# Altium footprint library Gesturelink PCB Library.PcbLib: 57 footprints (part 3 of 4)
Each footprint in its own frame and in the unit in brackets; x right, y up, seen from the top. Pads: shape width x height; smd on the part's side, far side on the other; paste and mask are expansions set on the pad; w line width, h text height; cw(c..) or ccw(c..) is an arc to the next point about the centre after c.
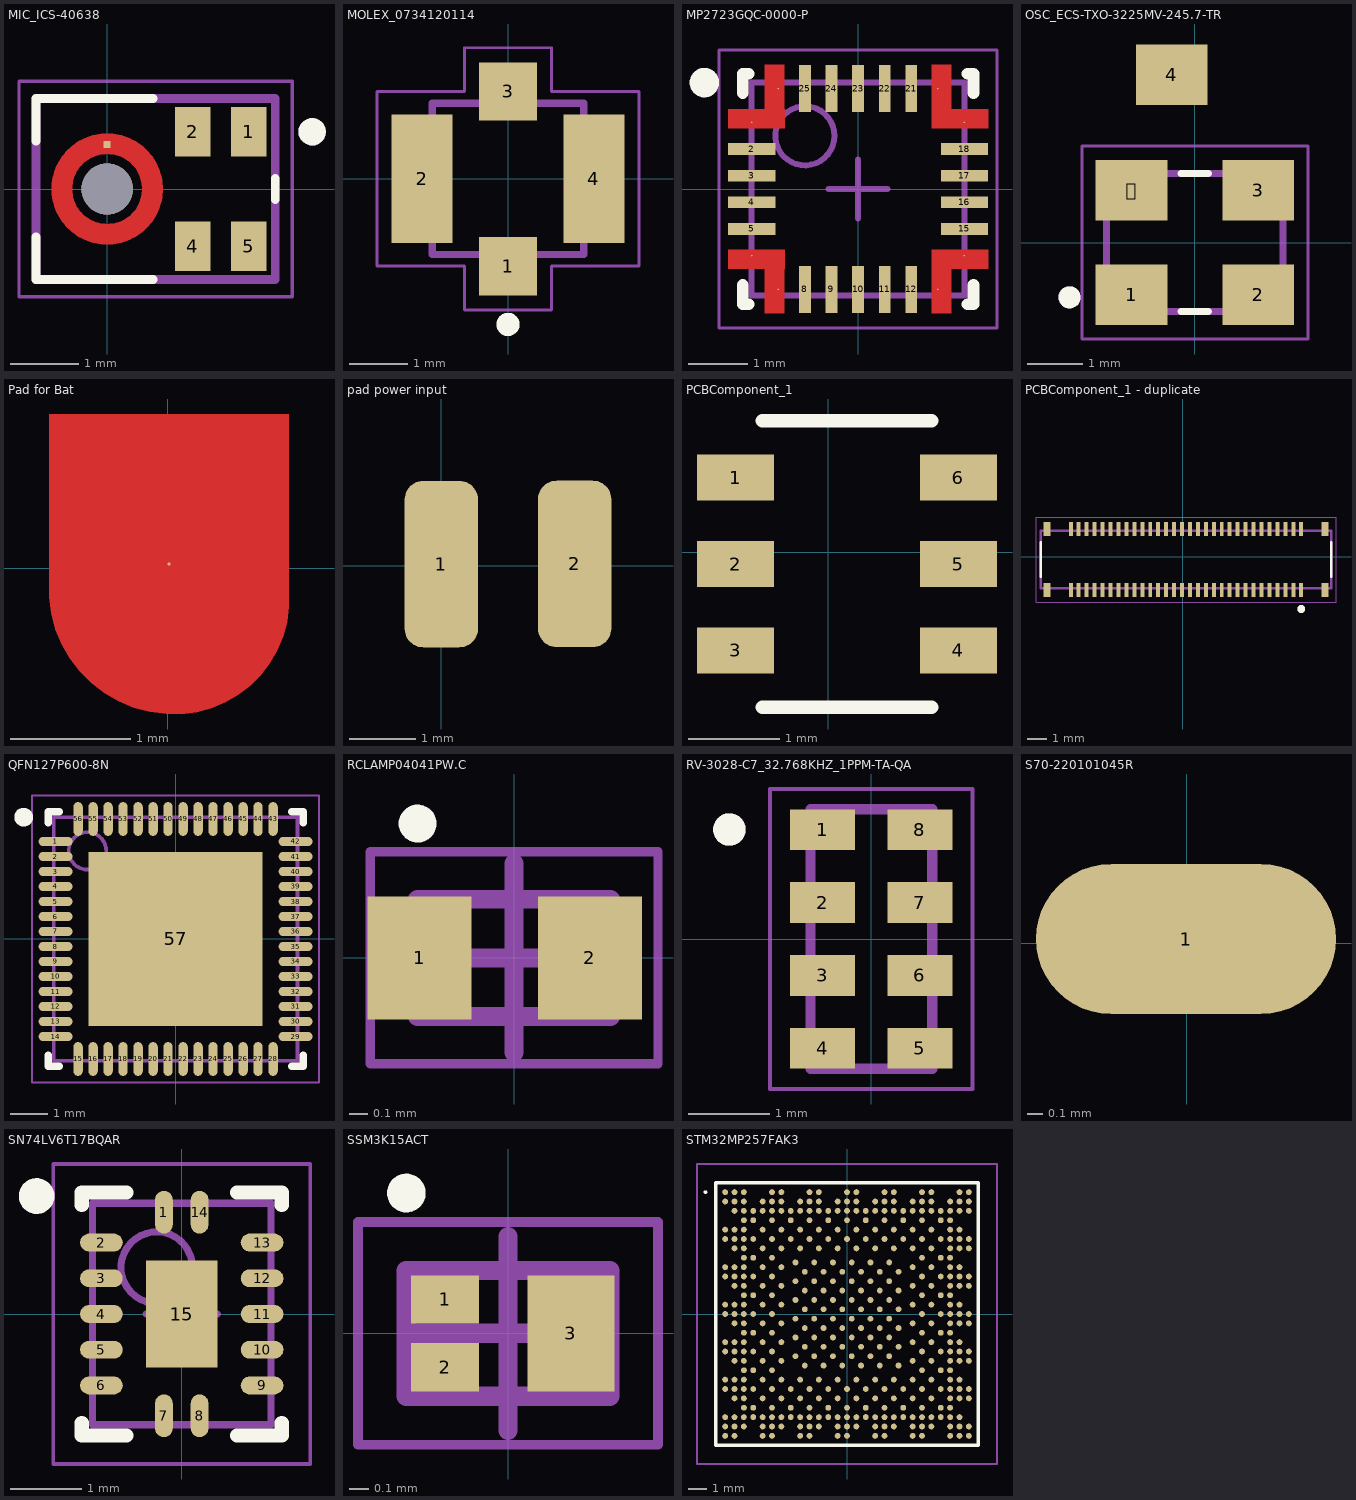
[diagram p2: the footprints below, top view; thin cyan lines are the x and y axes]

## MIC_ICS-40638 [mm]
pads (6):
  rect 0.522x0.725 smd paste-1: 1(2.074,0.837) 2(1.252,0.837) 4(1.252,-0.837) 5(2.074,-0.837)
  rect 0.1x0.1 smd paste-1 mask+0: 3(0,0.65)
  round 0.75 hole 0.75 unplated: ""(0,0)
Top Layer:
  region: 242 vertices and 0 holes, not listed, extent -0.813,-0.813 0.813,0.813
Top Overlay:
  circle w0.2: c3,0.837 r0.1
  lines w0.127: -1.04,-0.7 -1.04,-1.325 0.671,-1.325 ; -1.04,0.7 -1.04,1.325 0.671,1.325 ; 2.46,-0.155 2.46,0.155
Top Paste:
  drawing of 8 lines, arcs and shapes, not listed
Top Solder:
  circle w0.913: c0,0 r0.456
Mechanical 13:
  circle w0.2: c3,0.837 r0.1
  lines w0.127: -1.04,-1.325 -1.04,1.325 2.46,1.325 2.46,-1.325 -1.04,-1.325
Mechanical 15:
  lines w0.05: -1.29,-1.575 -1.29,1.575 2.71,1.575 2.71,-1.575 -1.29,-1.575

## MOLEX_0734120114 [mm]
pads (4):
  rect 1x1 smd: 1(0,-1.5) 3(0,1.5)
  rect 1.05x2.2 smd: 2(-1.475,0) 4(1.475,0)
Top Overlay:
  circle w0.2: c0,-2.5 r0.1
Bottom Solder:
  region: -0.85,-1.202 -2.104,-1.202 -2.104,1.2 -0.85,1.2
  region: 2.1,-1.201 0.851,-1.201 0.851,1.2 2.1,1.2
  region: 0.6,0.901 -0.601,0.901 -0.601,2.1 0.6,2.1
Mechanical 13:
  lines w0.127: -1.3,-1.3 -1.3,1.3 1.3,1.3 1.3,-1.3 -1.3,-1.3
Mechanical 15:
  lines w0.05: -2.25,-1.5 -2.25,1.5 -0.75,1.5 -0.75,2.25 0.75,2.25 0.75,1.5 2.25,1.5 2.25,-1.5 0.75,-1.5 0.75,-2.25 -0.75,-2.25 -0.75,-1.5 -2.25,-1.5
3D body "0734120110.stp": height 1.3, standoff 0.05, extent -1.5,-1.54 1.5,1.54

## MP2723GQC-0000-P [mm] "Charger IC Lithium Ion/Polymer 26-QFN (3.5x3.5)"
height 0.8
pads (26):
  round 0.025 smd: 1(-1.8,1.125) 6(-1.8,-1.125) 7(-1.35,-1.7) 13(1.35,-1.7) 14(1.8,-1.125) 19(1.8,1.125) 20(1.35,1.7) 26(-1.35,1.7)
  rect 0.8x0.2 smd: 2(-1.8,0.675) 3(-1.8,0.225) 4(-1.8,-0.225) 5(-1.8,-0.675) 15(1.8,-0.675) 16(1.8,-0.225) 17(1.8,0.225) 18(1.8,0.675)
  rect 0.2x0.8 smd: 8(-0.9,-1.7) 9(-0.45,-1.7) 10(0,-1.7) 11(0.45,-1.7) 12(0.9,-1.7) 21(0.9,1.7) 22(0.45,1.7) 23(0,1.7) 24(-0.45,1.7) 25(-0.9,1.7)
Top Layer:
  region: -2.2,1.025 -1.245,1.025 -1.245,1.346 -2.2,1.346
  region: -1.575,2.1 -1.575,1.3 -1.25,1.3 -1.25,2.1
  region: -1.575,-1.3 -1.575,-2.1 -1.25,-2.1 -1.25,-1.3
  region: 1.25,-1.3 1.25,-2.1 1.575,-2.1 1.575,-1.3
  region: 1.245,-1.346 2.2,-1.346 2.2,-1.025 1.245,-1.025
  region: 1.245,1.025 2.2,1.025 2.2,1.346 1.245,1.346
  region: 1.25,2.1 1.25,1.3 1.575,1.3 1.575,2.1
  region: -2.2,-1.346 -1.245,-1.346 -1.245,-1.025 -2.2,-1.025
Top Overlay:
  circle w0.25: c-2.6,1.8 r0.125
  lines w0.2: -1.95,-1.625 -1.95,-1.95 -1.85,-1.95 ; -1.95,1.625 -1.95,1.95 -1.85,1.95 ; 1.85,-1.95 1.95,-1.95 1.95,-1.625 ; 1.85,1.95 1.95,1.95 1.95,1.625
Mechanical 13:
  circle w0.1: c-0.9,0.9 r0.5
  lines w0.1: -1.8,-1.8 -1.8,1.8 1.8,1.8 1.8,-1.8 -1.8,-1.8
Mechanical 15:
  lines w0.05: -2.35,-2.35 -2.35,2.35 2.35,2.35 2.35,-2.35 -2.35,-2.35
  lines w0.1: -0.5,0 0.5,0 ; 0,-0.5 0,0.5
3D body: height 0.8, standoff 0.05, extent -1.8,-1.8 1.8,1.8

## OSC_ECS-TXO-3225MV-245.7-TR [mm]
pads (5):
  rect 1.3x1.1 smd: 1(-1.15,-0.95) 2(1.15,-0.95) 3(1.15,0.95) 4(-0.42,3.041) (-1.15,0.95)
Top Overlay:
  circle w0.2: c-2.275,-0.994 r0.1
  lines w0.127: -0.25,-1.25 0.25,-1.25 ; -0.25,1.25 0.25,1.25
Mechanical 13:
  circle w0.2: c-2.275,-0.994 r0.1
  lines w0.127: -1.6,-1.25 -1.6,1.25 1.6,1.25 1.6,-1.25 -1.6,-1.25
Mechanical 15:
  lines w0.05: -2.05,-1.75 2.05,-1.75 2.05,1.75 -2.05,1.75 -2.05,-1.75
3D body "step_temp.STEP": height 1.2, standoff 0, extent -1.6,-1.25 1.6,1.25

## Pad for Bat [mil]
pads (1):
  round 1 smd: 1(0.38,1.34)
Top Layer:
  region: -38.99,-6.76 -38.99,50.55 39.75,50.55 39.75,-10.25 39.75,-12.72 39.1,-17.61 37.83,-22.37 35.94,-26.93 33.48,-31.2 30.47,-35.11 26.99,-38.6 23.07,-41.6 18.8,-44.07 14.25,-45.95 9.48,-47.23 4.59,-47.87 2.13,-47.87 -0.57,-47.87 -5.91,-47.17 -11.12,-45.78 -16.1,-43.71 -20.77,-41.02 -25.04,-37.74 -28.85,-33.93 -32.14,-29.65 -34.83,-24.98 -36.89,-20 -38.29,-14.8 -38.99,-9.45

## pad power input [mm]
pads (2):
  rrect50% 1.1x2.5 smd: 1(-0.003,0.022) 2(2,0.025)

## PCBComponent_1 [mil]
pads (6):
  rect 33.41x20 smd paste+0 mask+0: 1(-40,32.4) 2(-40,-5) 3(-40,-42.4) 4(56.41,-42.4) 5(56.41,-5) 6(56.41,32.4)
Top Overlay:
  lines w6: -28.3,-67 44.7,-67 ; -28.3,57 44.7,57
3D body "TLV9061SQDBVRQ1--3DModel-STEP-56544.STEP": height 57.09, standoff 0, extent -50.12,-62.09 60.12,52.09

## PCBComponent_1 - duplicate [mm]
pads (64):
  rect 0.2x0.7 smd paste-1 mask+0.05: 1(5.968,-1.683) 2(5.968,1.397) 3(5.568,-1.683) 4(5.568,1.397) 5(5.168,-1.683) 6(5.168,1.397) 7(4.768,-1.683) 8(4.768,1.397) 9(4.368,-1.683) 10(4.368,1.397) 11(3.968,-1.683) 12(3.968,1.397) 13(3.568,-1.683) 14(3.568,1.397) 15(3.168,-1.683) 16(3.168,1.397) 17(2.768,-1.683) 18(2.768,1.397) 19(2.368,-1.683) 20(2.368,1.397) 21(1.968,-1.683) 22(1.968,1.397) 23(1.568,-1.683) 24(1.568,1.397) 25(1.168,-1.683) 26(1.168,1.397) 27(0.768,-1.683) 28(0.768,1.397) 29(0.368,-1.683) 30(0.368,1.397) 31(-0.032,-1.683) 32(-0.032,1.397) 33(-0.432,-1.683) 34(-0.432,1.397) 35(-0.832,-1.683) 36(-0.832,1.397) 37(-1.232,-1.683) 38(-1.232,1.397) 39(-1.632,-1.683) 40(-1.632,1.397) 41(-2.032,-1.683) 42(-2.032,1.397) 43(-2.432,-1.683) 44(-2.432,1.397) 45(-2.832,-1.683) 46(-2.832,1.397) 47(-3.232,-1.683) 48(-3.232,1.397) 49(-3.632,-1.683) 50(-3.632,1.397) 51(-4.032,-1.683) 52(-4.032,1.397) 53(-4.432,-1.683) 54(-4.432,1.397) 55(-4.832,-1.683) 56(-4.832,1.397) 57(-5.232,-1.683) 58(-5.232,1.397) 59(-5.632,-1.683) 60(-5.632,1.397)
  rect 0.35x0.7 smd paste-1: S1(7.168,-1.683) S2(7.168,1.397) S3(-6.832,-1.683) S4(-6.832,1.397)
Top Overlay:
  circle w0.2: c5.968,-2.633 r0.1
  lines w0.127: -7.132,-1.013 -7.132,0.727 ; 7.468,-1.013 7.468,0.727
Top Paste:
  drawing of 64 lines, arcs and shapes, not listed
Mechanical 13:
  circle w0.2: c5.968,-2.633 r0.1
  lines w0.127: -7.132,-1.583 7.468,-1.583 7.468,1.297 -7.132,1.297 -7.132,-1.583
Mechanical 15:
  lines w0.05: -7.382,-2.283 -7.382,1.997 7.718,1.997 7.718,-2.283 -7.382,-2.283
3D body "df40c-60ds-0_4v_51_.stp": height 1.5, standoff 0.05, extent -7.132,-1.792 7.468,1.588

## QFN127P600-8N [mm]
height 0.9
pads (57):
  oval 0.9x0.25 smd: 1(-3.2,2.6) 2(-3.2,2.2) 3(-3.2,1.8) 4(-3.2,1.4) 5(-3.2,1) 6(-3.2,0.6) 7(-3.2,0.2) 8(-3.2,-0.2) 9(-3.2,-0.6) 10(-3.2,-1) 11(-3.2,-1.4) 12(-3.2,-1.8) 13(-3.2,-2.2) 14(-3.2,-2.6) 29(3.2,-2.6) 30(3.2,-2.2) 31(3.2,-1.8) 32(3.2,-1.4) 33(3.2,-1) 34(3.2,-0.6) 35(3.2,-0.2) 36(3.2,0.2) 37(3.2,0.6) 38(3.2,1) 39(3.2,1.4) 40(3.2,1.8) 41(3.2,2.2) 42(3.2,2.6)
  oval 0.25x0.9 smd: 15(-2.6,-3.2) 16(-2.2,-3.2) 17(-1.8,-3.2) 18(-1.4,-3.2) 19(-1,-3.2) 20(-0.6,-3.2) 21(-0.2,-3.2) 22(0.2,-3.2) 23(0.6,-3.2) 24(1,-3.2) 25(1.4,-3.2) 26(1.8,-3.2) 27(2.2,-3.2) 28(2.6,-3.2) 43(2.6,3.2) 44(2.2,3.2) 45(1.8,3.2) 46(1.4,3.2) 47(1,3.2) 48(0.6,3.2) 49(0.2,3.2) 50(-0.2,3.2) 51(-0.6,3.2) 52(-1,3.2) 53(-1.4,3.2) 54(-1.8,3.2) 55(-2.2,3.2) 56(-2.6,3.2)
  rect 4.65x4.65 smd: 57(0,0)
Top Overlay:
  circle w0.25: c-4.05,3.25 r0.125
  lines w0.2: -3.4,-3.1 -3.4,-3.4 -3.1,-3.4 ; -3.4,3.1 -3.4,3.4 -3.1,3.4 ; 3.1,-3.4 3.4,-3.4 3.4,-3.1 ; 3.1,3.4 3.4,3.4 3.4,3.1
Mechanical 13:
  circle w0.1: c-2.35,2.35 r0.5
  lines w0.1: -3.25,-3.25 -3.25,3.25 3.25,3.25 3.25,-3.25 -3.25,-3.25
Mechanical 15:
  lines w0.05: -3.825,-3.825 -3.825,3.825 3.825,3.825 3.825,-3.825 -3.825,-3.825
  lines w0.1: -0.5,0 0.5,0 ; 0,-0.5 0,0.5
3D body: height 0.9, standoff 0.05, extent -3.25,-3.25 3.25,3.25

## RCLAMP04041PW.C [mm]
height 0.55
pads (2):
  rect 0.55x0.65 smd: 1(-0.5,0) 2(0.4,0)
Top Overlay:
  circle w0.1: c-0.51,0.71 r0.05
Mechanical 13:
  lines w0.1: -0.51,-0.31 -0.51,0.31 0.51,0.31 0.51,-0.31 -0.51,-0.31
Mechanical 15:
  lines w0.05: -0.76,-0.56 -0.76,0.56 0.76,0.56 0.76,-0.56 -0.76,-0.56
  lines w0.1: -0.5,0 0.5,0 ; 0,-0.5 0,0.5
3D body: height 0.55, standoff 0.03, extent -0.56,-0.31 0.46,0.31

## RV-3028-C7_32.768KHZ_1PPM-TA-QA [mm]
height 0.8
pads (8):
  rect 0.8x0.5 smd: 1(-0.6,1.35) 2(-0.6,0.45) 3(-0.6,-0.45) 4(-0.6,-1.35) 5(0.6,-1.35) 6(0.6,-0.45) 7(0.6,0.45) 8(0.6,1.35)
Top Overlay:
  circle w0.2: c-1.75,1.35 r0.1
Mechanical 13:
  circle w0.2: c-1.75,1.35 r0.1
  lines w0.127: -0.75,-1.6 0.75,-1.6 0.75,1.6 -0.75,1.6 -0.75,-1.6
Mechanical 15:
  lines w0.05: -1.25,-1.85 1.25,-1.85 1.25,1.85 -1.25,1.85 -1.25,-1.85
3D body "step_temp.STEP": height 0.8, standoff 0, extent -0.75,-1.6 0.75,1.6

## S70-220101045R [mm]
pads (1):
  oval 2x1 smd: 1(-0.006,0.028)

## SN74LV6T17BQAR [mm]
height 0.8
pads (15):
  oval 0.25x0.6 smd: 1(-0.25,1.425) 7(-0.25,-1.425) 8(0.25,-1.425) 14(0.25,1.425)
  oval 0.6x0.25 smd: 2(-1.125,1) 3(-1.125,0.5) 4(-1.125,0) 5(-1.125,-0.5) 6(-1.125,-1) 9(1.125,-1) 10(1.125,-0.5) 11(1.125,0) 12(1.125,0.5) 13(1.125,1)
  rect 1x1.5 smd: 15(0,0)
Top Overlay:
  circle w0.25: c-2.032,1.651 r0.125
  lines w0.2: -1.4,-1.525 -1.4,-1.7 -0.775,-1.7 ; -1.4,1.525 -1.4,1.7 -0.775,1.7 ; 0.775,-1.7 1.4,-1.7 1.4,-1.525 ; 0.775,1.7 1.4,1.7 1.4,1.525
Mechanical 13:
  circle w0.1: c-0.35,0.65 r0.5
  lines w0.1: -1.25,-1.55 1.25,-1.55 1.25,1.55 -1.25,1.55 -1.25,-1.55
Mechanical 15:
  lines w0.05: -1.8,-2.1 1.8,-2.1 1.8,2.1 -1.8,2.1 -1.8,-2.1
  lines w0.1: -0.5,0 0.5,0 ; 0,-0.5 0,0.5
3D body "SN74LV6T17BQAR.step": height 0.8, standoff 0, extent -1.3,-1.6 1.3,1.6

## SOIC127P1030X265-4N [mm] "SOIC, 4-Leads, Body 10.30x7.50mm, Pitch 1.27mm, IPC Medium Density"
height 2.65

## SSM3K15ACT [mm]
height 0.4
pads (3):
  rect 0.35x0.25 smd: 1(-0.325,0.175) 2(-0.325,-0.175)
  rect 0.45x0.6 smd: 3(0.325,0)
Top Overlay:
  circle w0.1: c-0.525,0.725 r0.05
Mechanical 13:
  lines w0.1: -0.525,-0.325 -0.525,0.325 0.525,0.325 0.525,-0.325 -0.525,-0.325
Mechanical 15:
  lines w0.05: -0.775,-0.575 -0.775,0.575 0.775,0.575 0.775,-0.575 -0.775,-0.575
  lines w0.1: -0.5,0 0.5,0 ; 0,-0.5 0,0.5
3D body: height 0.4, standoff 0.05, extent -0.525,-0.325 0.525,0.325

## STM32MP257FAK3 [mm]
pads (424):
  round 0.31 smd: A1(-6.5,6.5) A2(-6,6.5) A3(-5.5,6.5) A6(-4,6.5) A7(-3.5,6.5) A10(-2,6.5) A11(-1.5,6.5) A14(0,6.5) A15(0.5,6.5) A18(2,6.5) A19(2.5,6.5) A22(4,6.5) A23(4.5,6.5) A26(6,6.5) A27(6.5,6.5) AA1(-6.5,-3.5) AA2(-6,-3.5) AA3(-5.5,-3.5) AA5(-4.5,-3.5) AA7(-3.5,-3.5) AA9(-2.5,-3.5) AA11(-1.5,-3.5) AA13(-0.5,-3.5) AA15(0.5,-3.5) AA17(1.5,-3.5) AA19(2.5,-3.5) AA21(3.5,-3.5) AA23(4.5,-3.5) AA25(5.5,-3.5) AA26(6,-3.5) AAA1(-2.75,2.75) AAA3(-1.75,2.75) AAA5(-0.75,2.75) AAA7(0.25,2.75) AAA9(1.25,2.75) AAA11(2.25,2.75) AAB2(-2.25,2.25) AAB4(-1.25,2.25) AAB6(-0.25,2.25) AAB8(0.75,2.25) AAB10(1.75,2.25) AAB12(2.75,2.25) AAC1(-2.75,1.75) AAC3(-1.75,1.75) AAC5(-0.75,1.75) AAC7(0.25,1.75) AAC9(1.25,1.75) AAC11(2.25,1.75) AAD2(-2.25,1.25) AAD4(-1.25,1.25) AAD6(-0.25,1.25) AAD8(0.75,1.25) AAD10(1.75,1.25) AAD12(2.75,1.25) AAE1(-2.75,0.75) AAE3(-1.75,0.75) AAE5(-0.75,0.75) AAE7(0.25,0.75) AAE9(1.25,0.75) AAE11(2.25,0.75) AAF2(-2.25,0.25) AAF4(-1.25,0.25) AAF6(-0.25,0.25) AAF8(0.75,0.25) AAF10(1.75,0.25) AAF12(2.75,0.25) AAG1(-2.75,-0.25) AAG3(-1.75,-0.25) AAG5(-0.75,-0.25) AAG7(0.25,-0.25) AAG9(1.25,-0.25) AAG11(2.25,-0.25) AAH2(-2.25,-0.75) AAH4(-1.25,-0.75) AAH6(-0.25,-0.75) AAH8(0.75,-0.75) AAH10(1.75,-0.75) AAH12(2.75,-0.75) AAJ1(-2.75,-1.25) AAJ3(-1.75,-1.25) AAJ5(-0.75,-1.25) AAJ7(0.25,-1.25) AAJ9(1.25,-1.25) AAJ11(2.25,-1.25) AAK2(-2.25,-1.75) AAK4(-1.25,-1.75) AAK6(-0.25,-1.75) AAK8(0.75,-1.75) AAK10(1.75,-1.75) AAK12(2.75,-1.75) AAL1(-2.75,-2.25) AAL3(-1.75,-2.25) AAL5(-0.75,-2.25) AAL7(0.25,-2.25) AAL9(1.25,-2.25) AAL11(2.25,-2.25) AAM2(-2.25,-2.75) AAM4(-1.25,-2.75) AAM6(-0.25,-2.75) AAM8(0.75,-2.75) AAM10(1.75,-2.75) AAM12(2.75,-2.75) AB1(-6.5,-4) AB2(-6,-4) AB3(-5.5,-4) AB4(-5,-4) AB6(-4,-4) AB8(-3,-4) AB10(-2,-4) AB12(-1,-4) AB14(0,-4) AB16(1,-4) AB18(2,-4) AB20(3,-4) AB22(4,-4) AB24(5,-4) AB25(5.5,-4) AB26(6,-4) AB27(6.5,-4) AC2(-6,-4.5) AC3(-5.5,-4.5) AC5(-4.5,-4.5) AC7(-3.5,-4.5) AC9(-2.5,-4.5) AC11(-1.5,-4.5) AC13(-0.5,-4.5) AC15(0.5,-4.5) AC17(1.5,-4.5) AC19(2.5,-4.5) AC21(3.5,-4.5) AC23(4.5,-4.5) AC25(5.5,-4.5) AC26(6,-4.5) AC27(6.5,-4.5) AD3(-5.5,-5) AD4(-5,-5) AD6(-4,-5) AD8(-3,-5) AD10(-2,-5) AD12(-1,-5) AD14(0,-5) AD16(1,-5) AD18(2,-5) AD20(3,-5) AD22(4,-5) AD24(5,-5) AD25(5.5,-5) AE1(-6.5,-5.5) AE2(-6,-5.5) AE3(-5.5,-5.5) AE4(-5,-5.5) AE5(-4.5,-5.5) AE6(-4,-5.5) AE7(-3.5,-5.5) AE8(-3,-5.5) AE9(-2.5,-5.5) AE10(-2,-5.5) AE11(-1.5,-5.5) AE12(-1,-5.5) AE13(-0.5,-5.5) AE14(0,-5.5) AE15(0.5,-5.5) AE16(1,-5.5) AE17(1.5,-5.5) AE18(2,-5.5) AE19(2.5,-5.5) AE20(3,-5.5) AE21(3.5,-5.5) AE22(4,-5.5) AE23(4.5,-5.5) AE24(5,-5.5) AE25(5.5,-5.5) AE26(6,-5.5) AF1(-6.5,-6) AF2(-6,-6) AF3(-5.5,-6) AF5(-4.5,-6) AF6(-4,-6) AF7(-3.5,-6) AF9(-2.5,-6) AF10(-2,-6) AF11(-1.5,-6) AF13(-0.5,-6) AF14(0,-6) AF15(0.5,-6) AF17(1.5,-6) AF18(2,-6) AF19(2.5,-6) AF21(3.5,-6) AF22(4,-6) AF23(4.5,-6) AF25(5.5,-6) AF26(6,-6) AF27(6.5,-6) AG1(-6.5,-6.5) AG2(-6,-6.5) AG5(-4.5,-6.5) AG6(-4,-6.5) AG9(-2.5,-6.5) AG10(-2,-6.5) AG13(-0.5,-6.5) AG14(0,-6.5) AG17(1.5,-6.5) AG18(2,-6.5) AG21(3.5,-6.5) AG22(4,-6.5) AG25(5.5,-6.5) AG26(6,-6.5) AG27(6.5,-6.5) B1(-6.5,6) B2(-6,6) B3(-5.5,6) B5(-4.5,6) B6(-4,6) B7(-3.5,6) B9(-2.5,6) B10(-2,6) B11(-1.5,6) B13(-0.5,6) B14(0,6) B15(0.5,6) B17(1.5,6) B18(2,6) B19(2.5,6) B21(3.5,6) B22(4,6) B23(4.5,6) B25(5.5,6) B26(6,6) B27(6.5,6) C2(-6,5.5) C3(-5.5,5.5) C4(-5,5.5) C5(-4.5,5.5) C6(-4,5.5) C7(-3.5,5.5) C8(-3,5.5) C9(-2.5,5.5) C10(-2,5.5) C11(-1.5,5.5) C12(-1,5.5) C13(-0.5,5.5) C14(0,5.5) C15(0.5,5.5) C16(1,5.5) C17(1.5,5.5) C18(2,5.5) C19(2.5,5.5) C20(3,5.5) C21(3.5,5.5) C22(4,5.5) C23(4.5,5.5) C24(5,5.5) C25(5.5,5.5) C26(6,5.5) C27(6.5,5.5) D3(-5.5,5) D4(-5,5) D6(-4,5) D8(-3,5) D10(-2,5) D12(-1,5) D14(0,5) D16(1,5) D18(2,5) D20(3,5) D22(4,5) D24(5,5) D25(5.5,5) E1(-6.5,4.5) E2(-6,4.5) E3(-5.5,4.5) E5(-4.5,4.5) E7(-3.5,4.5) E9(-2.5,4.5) E11(-1.5,4.5) E13(-0.5,4.5) E15(0.5,4.5) E17(1.5,4.5) E19(2.5,4.5) E21(3.5,4.5) E23(4.5,4.5) E25(5.5,4.5) E26(6,4.5) F1(-6.5,4) F2(-6,4) F3(-5.5,4) F4(-5,4) F6(-4,4) F8(-3,4) F10(-2,4) F12(-1,4) F14(0,4) F16(1,4) F18(2,4) F20(3,4) F22(4,4) F24(5,4) F25(5.5,4) F26(6,4) F27(6.5,4) G2(-6,3.5) G3(-5.5,3.5) G5(-4.5,3.5) G7(-3.5,3.5) G9(-2.5,3.5) G11(-1.5,3.5) G13(-0.5,3.5) G15(0.5,3.5) G17(1.5,3.5) G19(2.5,3.5) G21(3.5,3.5) G23(4.5,3.5) G25(5.5,3.5) G26(6,3.5) G27(6.5,3.5) H3(-5.5,3) H4(-5,3) H6(-4,3) H22(4,3) H24(5,3) H25(5.5,3) J1(-6.5,2.5) J2(-6,2.5) J3(-5.5,2.5) J5(-4.5,2.5) J7(-3.5,2.5) J21(3.5,2.5) J23(4.5,2.5) J25(5.5,2.5) J26(6,2.5) K1(-6.5,2) K2(-6,2) K3(-5.5,2) K4(-5,2) K6(-4,2) K22(4,2) K24(5,2) K25(5.5,2) K26(6,2) K27(6.5,2) L2(-6,1.5) L3(-5.5,1.5) L5(-4.5,1.5) L7(-3.5,1.5) L21(3.5,1.5) L23(4.5,1.5) L25(5.5,1.5) L26(6,1.5) L27(6.5,1.5) M3(-5.5,1) M4(-5,1) M6(-4,1) M22(4,1) M24(5,1) M25(5.5,1) N1(-6.5,0.5) N2(-6,0.5) N3(-5.5,0.5) N5(-4.5,0.5) N7(-3.5,0.5) N21(3.5,0.5) N23(4.5,0.5) N25(5.5,0.5) N26(6,0.5) P1(-6.5,0) P2(-6,0) P3(-5.5,0) P4(-5,0) P6(-4,0) P22(4,0) P24(5,0) P25(5.5,0) P26(6,0) P27(6.5,0) R2(-6,-0.5) R3(-5.5,-0.5) R5(-4.5,-0.5) R7(-3.5,-0.5) R21(3.5,-0.5) R23(4.5,-0.5) R25(5.5,-0.5) R26(6,-0.5) R27(6.5,-0.5) T3(-5.5,-1) T4(-5,-1) T6(-4,-1) T22(4,-1) T24(5,-1) T25(5.5,-1) U1(-6.5,-1.5) U2(-6,-1.5) U3(-5.5,-1.5) U5(-4.5,-1.5) U7(-3.5,-1.5) U21(3.5,-1.5) U23(4.5,-1.5) U25(5.5,-1.5) U26(6,-1.5) V1(-6.5,-2) V2(-6,-2) V3(-5.5,-2) V4(-5,-2) V6(-4,-2) V22(4,-2) V24(5,-2) V25(5.5,-2) V26(6,-2) V27(6.5,-2) W2(-6,-2.5) W3(-5.5,-2.5) W5(-4.5,-2.5) W7(-3.5,-2.5) W21(3.5,-2.5) W23(4.5,-2.5) W25(5.5,-2.5) W26(6,-2.5) W27(6.5,-2.5) Y3(-5.5,-3) Y4(-5,-3) Y6(-4,-3) Y22(4,-3) Y24(5,-3) Y25(5.5,-3)
Top Overlay:
  lines w0.1: -7.6,6.5 ccw(c-7.55,6.5) -7.5,6.5 ccw(c-7.55,6.5) -7.6,6.5
  lines w0.2: -7,-7 -7,7 7,7 7,-7 -7,-7
Mechanical 13:
  lines w0.1: -7,-7 -7,7 7,7 7,-7 -7,-7
Mechanical 15:
  lines w0.1: -8,-8 -8,8 8,8 8,-8 -8,-8
3D body "STM32MP257FAK3.stp": height 1.16, standoff 0, extent -7,-7 7,7